# Altium footprint library bethu.PcbLib: 628 footprints (part 21 of 40)
Each footprint in its own frame and in the unit in brackets; x right, y up, seen from the top. Pads: shape width x height; smd on the part's side, far side on the other; paste and mask are expansions set on the pad; w line width, h text height; cw(c..) or ccw(c..) is an arc to the next point about the centre after c.
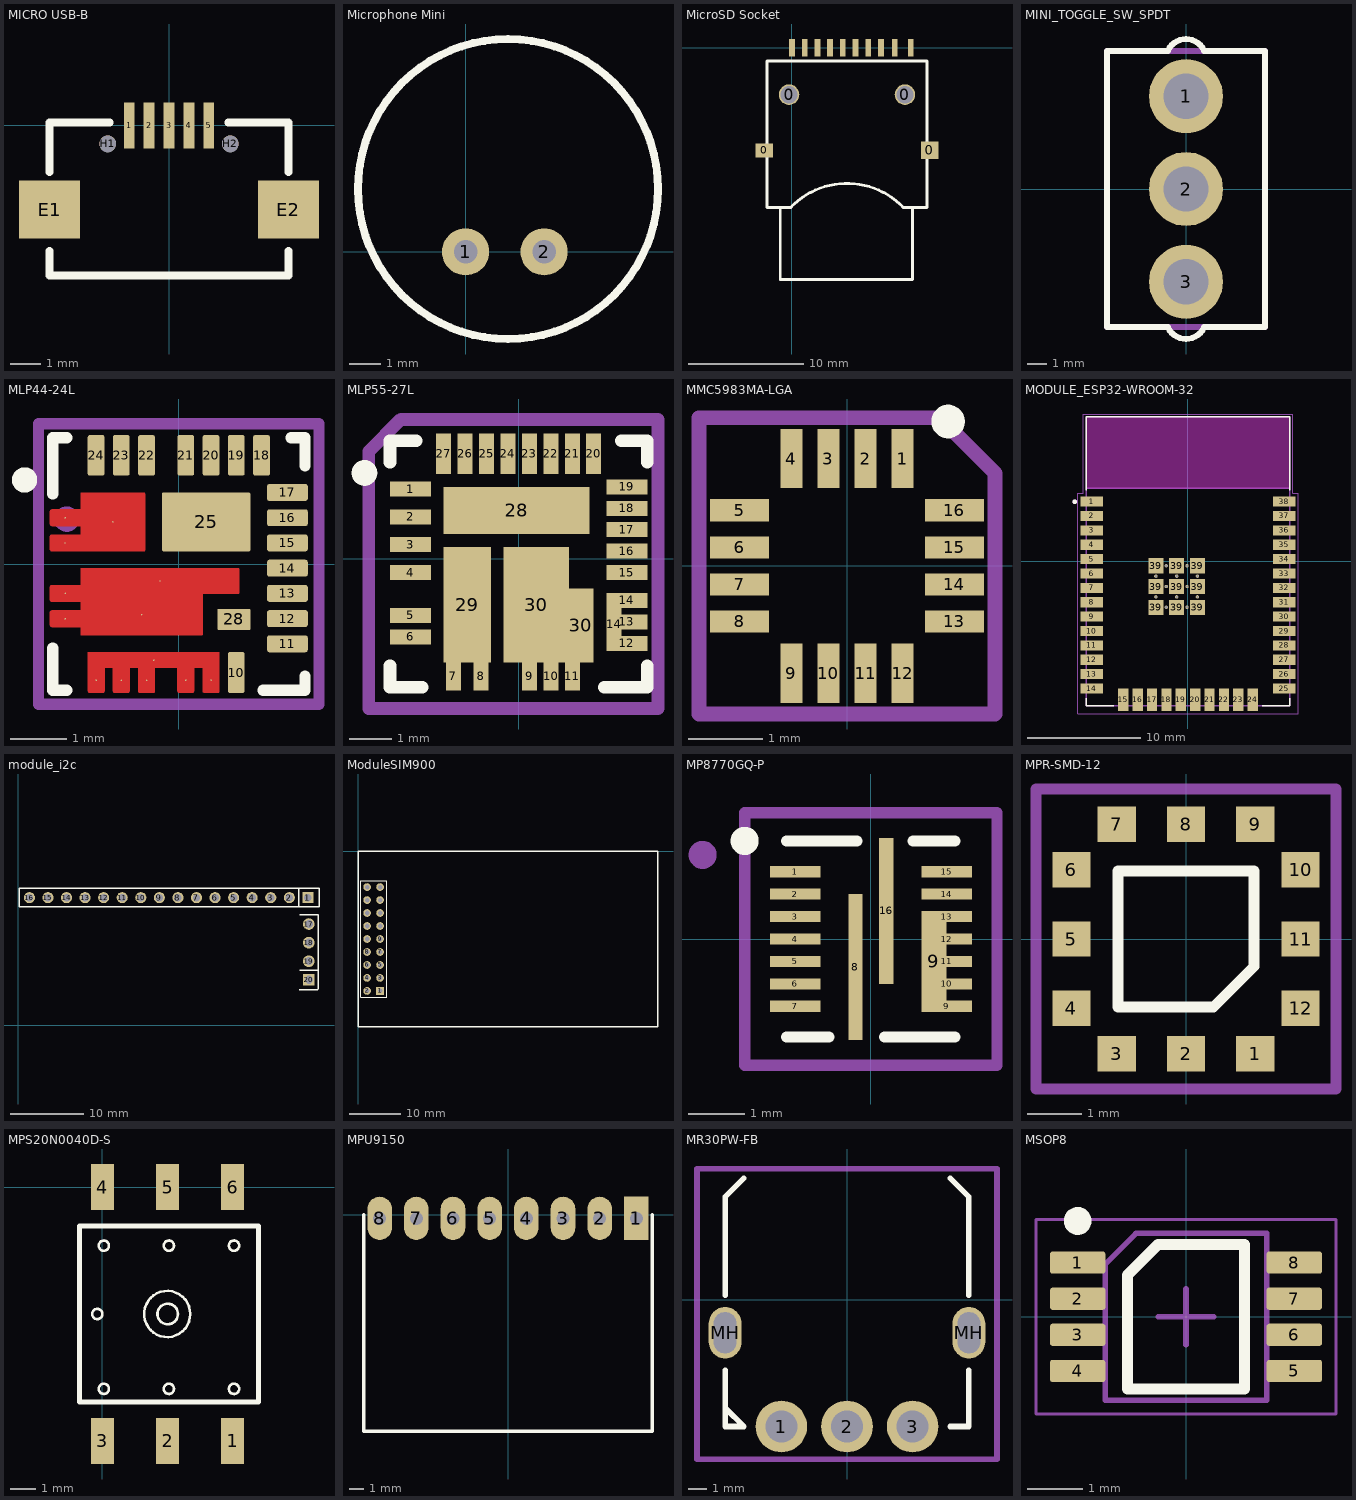
[diagram p20: the footprints below, top view; thin cyan lines are the x and y axes]

## MICRO USB-B [mm]
pads (9):
  rect 0.35x1.5 smd: 1(-1.3,0) 2(-0.65,0) 3(0,0) 4(0.65,0) 5(1.3,0)
  rect 2x1.9 smd: E1(-3.9,-2.75) E2(3.9,-2.75)
  round 0.55 hole 0.55: H1(-2,-0.6) H2(2,-0.6)
Top Overlay:
  lines w0.254: -3.9,-4.101 -3.9,-4.9 3.9,-4.9 3.9,-4.101 ; -3.9,-1.524 -3.9,0.1 -1.932,0.1 ; 1.932,0.1 3.9,0.1 3.9,-1.524
3D body "User Library-Micro USB.STEP": height 2.74, standoff -0.2, extent -3.99,-5.32 3.99,0.11

## Microphone Mini [mil]
pads (2):
  round 60 hole 30: 1(0,0) 2(100,0)
Top Overlay:
  circle w10: c54.06,80 r190.94
3D body "cma-4544pf-w.stp": height 185.04, standoff -177.17, extent -140.94,-110.94 240.95,270.94

## MicroSD Socket [mm]
pads (14):
  rect 1.5x1.2 smd: 0(-2.413,-8.89)
  round 1.778 hole 1.5 unplated: 0(-0.254,-4.064) 0(9.779,-4.064)
  rect 0.5x1.5 smd: 0(8.89,0) 0(10.287,0) 1(0,0) 2(1.1,0) 3(2.2,0) 4(3.3,0) 5(4.4,0) 6(5.5,0) 7(6.6,0) 8(7.7,0)
  rect 1.5x1.5 smd: 0(11.938,-8.89)
Top Overlay:
  lines w0.254: -0.127,-13.843 -1.016,-13.843 ; -0.125,-13.845 cw(c4.763,-18.479) 9.65,-13.845 ; 9.652,-13.843 10.414,-13.843 ; -1.016,-13.843 -2.159,-13.843 -2.159,-1.143 11.684,-1.143 11.684,-13.843 10.414,-13.843 ; -1.016,-13.843 -1.016,-20.066 10.414,-20.066 10.414,-13.843
3D body "User Library-Socket-MicroSD-Type1-with-SDCard.STEP": height 1.81, standoff -0.53, extent -2.286,-20.1 11.814,0

## MINI_TOGGLE_SW_SPDT [mm]
pads (3):
  round 3.75 hole 2.3: 1(0,4.7) 2(0,0) 3(0,-4.7)
Top Overlay:
  lines w0.3: -0.922,-7 -4,-7 -4,-0.5 -4,7 -0.922,7 ; -0.906,-7.023 ccw(c0,-6.6) 0.906,-7.023 ; -0.906,7.023 cw(c0,6.6) 0.906,7.023 ; 0.922,-7 4,-7 4,7 0.922,7
Mechanical 13:
  lines w0.3: -4,-7 4,-7 4,7 -4,7 -4,-7
  text "'.Designator'" at -5.815,-0.9 h1
3D body "Mini Toggle.step": height 27.29, standoff -3.93, extent -3.43,-6.35 3.43,6.35

## MLP44-24L [mm]
height 0.8
pads (30):
  round 0.025 smd mask+0.1: 1(-2.025,0.825) 2(-2.025,0.375) 3(-2.025,-0.525) 4(-2.025,-0.975) 5(-1.475,-2.075) 5(-0.45,-1.713) 6(-1.025,-2.075) 7(-0.575,-2.075) 8(0.125,-2.075) 9(0.575,-2.075)
  rrect25% 0.3x0.73 smd mask+0.1: 10(1.025,-1.935)
  rrect25% 0.725x0.3 smd mask+0.1: 11(1.937,-1.424) 12(1.937,-0.974) 13(1.937,-0.524) 14(1.937,-0.074) 15(1.937,0.376) 16(1.937,0.826) 17(1.937,1.276)
  rrect25% 0.3x0.725 smd mask+0.1: 18(1.475,1.938) 19(1.025,1.938) 20(0.575,1.938) 21(0.125,1.938) 22(-0.575,1.938) 23(-1.025,1.938) 24(-1.475,1.938)
  rrect5% 1.575x1.05 smd mask+0.07: 25(0.488,0.75)
  round 0.025 smd mask+0.102: 26(-1.175,0.75)
  round 0.025 smd mask+0.07: 27(-0.663,-0.902) 27(-0.338,-0.303)
  rrect5% 0.58x0.38 smd mask+0.07: 28(0.984,-0.989)
Top Layer:
  region: -0.626,0.225 -1.75,0.225 -1.75,1.275 -0.626,1.275 -0.621,1.275 -0.611,1.271 -0.604,1.264 -0.6,1.254 -0.6,1.249 -0.6,0.251 -0.6,0.246 -0.604,0.236 -0.611,0.229 -0.621,0.225
  region: -1.325,-2.263 -1.325,-2.27 -1.331,-2.284 -1.341,-2.294 -1.355,-2.3 -1.362,-2.3 -1.588,-2.3 -1.595,-2.3 -1.609,-2.294 -1.619,-2.284 -1.625,-2.27 -1.625,-2.263 -1.625,-1.85 -1.325,-1.85
  region: 0.725,-2.263 0.725,-2.27 0.719,-2.284 0.709,-2.294 0.695,-2.3 0.688,-2.3 0.462,-2.3 0.455,-2.3 0.441,-2.294 0.431,-2.284 0.425,-2.27 0.425,-2.263 0.425,-1.85 0.725,-1.85
  region: 0.275,-2.263 0.275,-2.27 0.269,-2.284 0.259,-2.294 0.245,-2.3 0.238,-2.3 0.012,-2.3 0.005,-2.3 -0.009,-2.294 -0.019,-2.284 -0.025,-2.27 -0.025,-2.263 -0.025,-1.85 0.275,-1.85
  region: -0.425,-2.263 -0.425,-2.27 -0.431,-2.284 -0.441,-2.294 -0.455,-2.3 -0.462,-2.3 -0.688,-2.3 -0.695,-2.3 -0.709,-2.294 -0.719,-2.284 -0.725,-2.27 -0.725,-2.263 -0.725,-1.85 -0.425,-1.85
  region: -0.875,-2.263 -0.875,-2.27 -0.881,-2.284 -0.891,-2.294 -0.905,-2.3 -0.912,-2.3 -1.138,-2.3 -1.145,-2.3 -1.159,-2.294 -1.169,-2.284 -1.175,-2.27 -1.175,-2.263 -1.175,-1.85 -0.875,-1.85
  region: 0.725,-1.85 -1.625,-1.85 -1.625,-1.582 -1.625,-1.581 -1.624,-1.578 -1.622,-1.577 -1.619,-1.575 -1.618,-1.575 0.718,-1.575 0.719,-1.575 0.722,-1.577 0.724,-1.578 0.725,-1.581 0.725,-1.582
  region: -2.263,0.675 -2.27,0.675 -2.284,0.681 -2.294,0.691 -2.3,0.705 -2.3,0.712 -2.3,0.938 -2.3,0.945 -2.294,0.959 -2.284,0.969 -2.27,0.975 -2.263,0.975 -1.75,0.975 -1.75,0.675
  region: -2.263,0.225 -2.27,0.225 -2.284,0.231 -2.294,0.241 -2.3,0.255 -2.3,0.262 -2.3,0.488 -2.3,0.495 -2.294,0.509 -2.284,0.519 -2.27,0.525 -2.263,0.525 -1.75,0.525 -1.75,0.225
  region: -2.263,-0.675 -2.27,-0.675 -2.284,-0.669 -2.294,-0.659 -2.3,-0.645 -2.3,-0.638 -2.3,-0.412 -2.3,-0.405 -2.294,-0.391 -2.284,-0.381 -2.27,-0.375 -2.263,-0.375 -1.75,-0.375 -1.75,-0.675
  region: -2.263,-1.125 -2.27,-1.125 -2.284,-1.119 -2.294,-1.109 -2.3,-1.095 -2.3,-1.088 -2.3,-0.862 -2.3,-0.855 -2.294,-0.841 -2.284,-0.831 -2.27,-0.825 -2.263,-0.825 -1.75,-0.825 -1.75,-1.125
  region: -1.732,-1.275 -1.736,-1.275 -1.742,-1.272 -1.748,-1.266 -1.751,-1.26 -1.751,-1.256 -1.751,-0.529 0.425,-0.529 0.425,-1.256 0.425,-1.26 0.422,-1.266 0.416,-1.272 0.41,-1.275 0.406,-1.275
  region: 1.063,-0.53 -1.751,-0.53 -1.751,-0.087 -1.751,-0.085 -1.749,-0.08 -1.746,-0.077 -1.741,-0.075 -1.739,-0.075 1.063,-0.075 1.065,-0.075 1.07,-0.077 1.073,-0.08 1.075,-0.085 1.075,-0.087 1.075,-0.519 1.075,-0.521 1.073,-0.526 1.07,-0.529 1.065,-0.53
Top Overlay:
  circle w0.25: c-2.75,1.5 r0.1
  lines w0.2: -2.25,-1.5 -2.25,-2.25 -2,-2.25 ; -2.25,1.25 -2.25,2.25 -2,2.25 ; 1.5,-2.25 2.25,-2.25 2.25,-2 ; 2,2.25 2.25,2.25 2.25,1.75
Mechanical 13:
  circle w0.25: c-2,0.8 r0.1
  lines w0.2: -2.5,-2.5 2.5,-2.5 2.5,2.5 -2.5,2.5 -2.5,-2.5
  text "'.Designator'" at -5.665,-0.417 h1
3D body "SIC438BED-T1-GE3.stp": height 0.9, standoff 0, extent -2,-2 2,2

## MLP55-27L [mm]
pads (32):
  rect 0.95x0.35 smd mask+0.1: 1(-2.525,1.625) 2(-2.525,0.975) 3(-2.525,0.325) 4(-2.525,-0.325) 5(-2.525,-1.325) 6(-2.525,-1.825) 12(2.525,-1.975) 13(2.525,-1.475) 14(2.525,-0.975) 15(2.525,-0.325) 16(2.525,0.175) 17(2.525,0.675) 18(2.525,1.175) 19(2.525,1.675)
  rect 0.35x0.65 smd mask+0.1: 7(-1.525,-2.75) 8(-0.875,-2.75) 9(0.255,-2.75) 10(0.755,-2.75) 11(1.255,-2.75)
  rect 0.35x0.95 smd mask+0.05: 14(2.225,-1.525)
  rect 0.35x0.95 smd mask+0.1: 20(1.75,2.45) 21(1.25,2.45) 22(0.75,2.45) 23(0.25,2.45) 24(-0.25,2.45) 25(-0.75,2.45) 26(-1.25,2.45) 27(-1.75,2.45)
  rect 3.4x1.1 smd mask+0.05: 28(-0.05,1.125)
  rect 1.1x2.7 smd mask+0.05: 29(-1.2,-1.075)
  rect 1.52x2.7 smd mask+0.05: 30(0.41,-1.075)
  rect 0.58x1.73 smd mask+0.05: 30(1.45,-1.56)
Top Overlay:
  circle w0.3: c-3.6,2 r0.15
  lines w0.3: -3,-2.5 -3,-3 -2.25,-3 ; -3,2.25 -3,2.75 -2.4,2.75 ; 2,-3 3,-3 3,-2.5 ; 2.4,2.75 3,2.75 3,2.25
Mechanical 13:
  lines w0.3: -3.5,-3.5 3.25,-3.5 3.25,3.25 -2.75,3.25 -3.5,2.5 -3.5,-3.5
  text "'.Designator'" at -6.315,-1.4 h1
3D body "MLP55-27L.STEP": height 0.8, standoff 0, extent -2.5,-2.575 2.501,2.425

## MMC5983MA-LGA [mm]
pads (16):
  rect 0.3x0.8 smd mask+0.05: 1(0.75,1.45) 2(0.25,1.45) 3(-0.25,1.45) 4(-0.75,1.45) 9(-0.75,-1.45) 10(-0.25,-1.45) 11(0.25,-1.45) 12(0.75,-1.45)
  rect 0.8x0.3 smd mask+0.05: 5(-1.45,0.75) 6(-1.45,0.25) 7(-1.45,-0.25) 8(-1.45,-0.75) 13(1.45,-0.75) 14(1.45,-0.25) 15(1.45,0.25) 16(1.45,0.75)
Top Overlay:
  circle w0.25: c1.364,1.95 r0.101
Mechanical 13:
  lines w0.2: -2,-2 2,-2 2,1.25 1.25,2 -2,2 -2,-0.25 -2,-2
3D body "MMC5983MA.step": height 0.99, standoff 0, extent -1.549,-1.549 1.549,1.549

## MODULE_ESP32-WROOM-32 [mm]
height 3.2
pads (59):
  rect 2x0.9 smd: 1(-8.5,5.26) 2(-8.5,3.99) 3(-8.5,2.72) 4(-8.5,1.45) 5(-8.5,0.18) 6(-8.5,-1.09) 7(-8.5,-2.36) 8(-8.5,-3.63) 9(-8.5,-4.9) 10(-8.5,-6.17) 11(-8.5,-7.44) 12(-8.5,-8.71) 13(-8.5,-9.98) 14(-8.5,-11.25) 25(8.5,-11.25) 26(8.5,-9.98) 27(8.5,-8.71) 28(8.5,-7.44) 29(8.5,-6.17) 30(8.5,-4.9) 31(8.5,-3.63) 32(8.5,-2.36) 33(8.5,-1.09) 34(8.5,0.18) 35(8.5,1.45) 36(8.5,2.72) 37(8.5,3.99) 38(8.5,5.26)
  rect 0.9x2 smd: 15(-5.715,-12.25) 16(-4.445,-12.25) 17(-3.175,-12.25) 18(-1.905,-12.25) 19(-0.635,-12.25) 20(0.635,-12.25) 21(1.905,-12.25) 22(3.175,-12.25) 23(4.445,-12.25) 24(5.715,-12.25)
  rect 1.33x1.33 smd: 39(-2.835,-4.075) 39(-2.835,-2.24) 39(-2.835,-0.405) 39(-1,-4.075) 39(-1,-2.24) 39(-1,-0.405) 39(0.835,-4.075) 39(0.835,-2.24) 39(0.835,-0.405)
  round 0.3 hole 0.2: 39_10(-1.917,-0.405) 39_11(-0.082,-0.405) 39_12(-2.835,-1.322) 39_13(-1,-1.322) 39_14(0.835,-1.322) 39_15(-1.917,-2.24) 39_16(-0.082,-2.24) 39_17(-2.835,-3.157) 39_18(-1,-3.157) 39_19(0.835,-3.157) 39_20(-1.917,-4.075) 39_21(-0.082,-4.075)
Top Overlay:
  circle w0.2: c-10,5.25 r0.1
  lines w0.127: -9,-12.1 -9,-12.75 -6.55,-12.75 ; -9,6.25 -9,12.75 9,12.75 9,6.25 ; 6.55,-12.75 9,-12.75 9,-12.1
Keep-Out Layer:
  region: 9,6.45 -9,6.45 -9,12.75 9,12.75
  region: 9,6.45 -9,6.45 -9,12.75 9,12.75
Mechanical 13:
  circle w0.2: c-10,5.25 r0.1
  lines w0.127: -9,6.45 9,6.45 ; -9,6.45 -9,12.75 9,12.75 9,6.45 ; -9,6.45 -9,-12.75 9,-12.75 9,6.45
  text "ANTENNA" at -6,9 h1.78
Mechanical 15:
  lines w0.05: -9.75,-13.5 -9.75,6 -9.25,6 -9.25,13 9.25,13 9.25,6 9.75,6 9.75,-13.5 -9.75,-13.5
3D body "step_temp.STEP": height 3.2, standoff 0, extent -9,-12.75 9,12.75

## module_i2c [mm]
pads (20):
  rect 1.52x1.52 hole 1.02: 1(39.599,17.424)
  round 1.52 hole 1.02: 2(37.059,17.424) 3(34.519,17.424) 4(31.979,17.424) 5(29.439,17.424) 6(26.899,17.424) 7(24.359,17.424) 8(21.819,17.424) 9(19.279,17.424) 10(16.739,17.424) 11(14.199,17.424) 12(11.659,17.424) 13(9.119,17.424) 14(6.579,17.424) 15(4.039,17.424) 16(1.499,17.424)
  round 1.6 hole 1.1: 17(39.726,13.818) 18(39.726,11.278) 19(39.726,8.738)
  rect 1.6x1.6 hole 1.1: 20(39.726,6.198)
Top Overlay:
  lines w0.2: 38.329,16.154 38.329,18.694 ; 38.405,4.851 40.945,4.851 ; 38.456,7.468 40.996,7.468 ; 38.456,15.088 40.996,15.088 40.996,4.928 ; 0.076,16.154 38.964,16.154 41.118,16.154 41.118,18.694 0.076,18.694 0.076,16.154
3D body "61300411121.stp": height 5.54, standoff -6, extent 38.456,4.928 40.996,15.088
3D body "1602 I2c v1.STEP": height 9.34, standoff -5.5, extent -0.025,0.178 41.575,19.335

## ModuleSIM900 [mm]
pads (18):
  rect 1.5x1.5 hole 0.9: 1(4.318,-27.305)
  round 1.5 hole 0.9: 2(1.778,-27.305) 3(4.318,-24.765) 4(1.778,-24.765) 5(4.318,-22.225) 6(1.778,-22.225) 7(4.318,-19.685) 8(1.778,-19.685) 9(4.318,-17.145) 10(1.778,-17.145) 11(4.318,-14.605) 12(1.778,-14.605) 13(4.318,-12.065) 14(1.778,-12.065) 15(4.318,-9.525) 16(1.778,-9.525) 17(4.318,-6.985) 18(1.778,-6.985)
Top Overlay:
  lines w0.2: 0.508,-28.575 0.508,-5.715 5.588,-5.715 5.588,-28.575 0.508,-28.575
  lines w0.254: 0,-34.29 58.7,-34.29 58.7,0 0,0 0,-34.29
3D body "User Library-RM254_4pin.STEP": height 6.02, standoff -3.1, extent 3.048,-15.875 5.588,-5.715
3D body "User Library-RM254_4pin.STEP": height 6.02, standoff -3.1, extent 0.508,-15.875 3.048,-5.715
3D body "User Library-RM254_4pin.STEP": height 6.02, standoff -3.1, extent 3.048,-20.955 5.588,-10.795
3D body "User Library-RM254_4pin.STEP": height 6.02, standoff -3.1, extent 0.508,-23.495 3.048,-13.335
3D body "User Library-RM254_4pin.STEP": height 6.02, standoff -3.1, extent 0.508,-28.575 3.048,-18.415
3D body "User Library-RM254_4pin.STEP": height 6.02, standoff -3.1, extent 3.048,-28.575 5.588,-18.415

## MP8770GQ-P [mm]
pads (17):
  rect 0.9x0.2 smd: 1(-1.35,1.2) 2(-1.35,0.8) 3(-1.35,0.4) 4(-1.35,0) 5(-1.35,-0.4) 6(-1.35,-0.8) 7(-1.35,-1.2) 9(1.35,-1.2) 10(1.35,-0.8) 11(1.35,-0.4) 12(1.35,0) 13(1.35,0.4) 14(1.35,0.8) 15(1.35,1.2)
  rect 0.25x2.6 smd: 8(-0.275,-0.5) 16(0.275,0.5)
  rect 0.45x1.8 smd: 9(1.125,-0.4)
Top Overlay:
  circle w0.3: c-2.25,1.75 r0.1
  lines w0.2: -1.5,-1.75 -0.75,-1.75 ; -1.5,1.75 -0.25,1.75 ; 0.25,-1.75 1.5,-1.75 ; 0.75,1.75 1.5,1.75
Mechanical 13:
  circle w0.3: c-3,1.5 r0.1
  lines w0.2: -2.25,-2.25 2.25,-2.25 2.25,2.25 -2.25,2.25 -2.25,-2.25
  text "'.Designator'" at -5.815,-0.9 h1
3D body "MP8770CGQ.step": height 0.86, standoff 0.01, extent -1.5,-1.5 1.5,1.5

## MPR-SMD-12 [mm]
pads (12):
  rect 0.7x0.65 smd mask+0.03: 1(1.27,-2.1) 2(0,-2.1) 3(-1.27,-2.1) 4(-2.1,-1.27) 5(-2.1,0) 6(-2.1,1.27) 7(-1.27,2.1) 8(0,2.1) 9(1.27,2.1) 10(2.1,1.27) 11(2.1,0) 12(2.1,-1.27)
Top Overlay:
  lines w0.2: -1.25,-1.25 0.5,-1.25 1.25,-0.5 1.25,1.25 -1.25,1.25 -1.25,-1.25
Mechanical 13:
  lines w0.2: -2.75,-2.75 2.75,-2.75 2.75,2.75 -2.75,2.75 -2.75,-2.75
  text "'.Designator'" at -5.84,-0.925 h1
3D body "MPRLS.stp": height 5.83, standoff 0.01, extent -2.444,-2.445 2.446,2.445

## MPS20N0040D-S [mm]
pads (6):
  rect 0.9x1.8 smd: 1(5.08,-9.906) 2(2.54,-9.906) 3(0,-9.906) 4(0,0) 5(2.54,0) 6(5.08,0)
Top Overlay:
  circle w0.1: c2.548,-4.953 r0.4
  circle w0.1: c2.529,-4.953 r0.9
  circle w0.1: c-0.2,-4.953 r0.2
  circle w0.1: c0.054,-2.286 r0.2
  circle w0.1: c2.594,-2.286 r0.2
  circle w0.1: c5.134,-2.286 r0.2
  circle w0.1: c0.054,-7.874 r0.2
  circle w0.1: c2.594,-7.874 r0.2
  circle w0.1: c5.134,-7.874 r0.2
  lines w0.2: -0.889,-8.382 6.096,-8.382 6.096,-1.524 -0.889,-1.524 -0.889,-8.382
3D body "mps20n1.STEP": height 10, standoff 0, extent -0.96,-10.103 6.04,0.197

## MPU9150 [mm]
pads (8):
  rect 1.7x3 hole 0.9: 1(8.89,-0.254)
  oval 1.7x3 hole 0.9: 2(6.35,-0.254) 3(3.81,-0.254) 4(1.27,-0.254) 5(-1.27,-0.254) 6(-3.81,-0.254) 7(-6.35,-0.254) 8(-8.89,-0.254)
Top Overlay:
  lines w0.254: -10,0 -10,-15 10,-15 10,0

## MR30PW-FB [mm]
pads (5):
  round 2.75 hole 1.7: 1(-3.5,-6.75) 2(0,-6.75) 3(3.5,-6.75)
  oval 1.75x2.75 hole 1.2 slot 2.2 at 90 deg: MH(-6.5,-1.75) MH(6.5,-1.75)
Top Overlay:
  lines w0.3: -6.5,-3.75 -6.5,-6.75 -5.5,-6.75 -6.5,-5.75 ; -6.5,0.25 -6.5,5.5 -5.5,6.5 ; 5.5,-6.75 6.5,-6.75 6.5,-4 6.5,-3.75 ; 5.5,6.5 6.5,5.5 6.5,0.25 ; -6.5,-5.75 -6.5,-5.75
Mechanical 13:
  lines w0.3: -8,-8.5 8,-8.5 8,7 -8,7 -8,-8.5
  text "'.Designator'" at -5.84,-0.925 h1
3D body "MR30PW-FB.STEP": height 4.96, standoff -1.99, extent -7.7,-7.7 7.7,6.75

## MSOP8 [mm] "TSOP, 8-Leads, Body 2.90x2.80mm, Pitch 0.65mm, IPC Medium Density"
height 0.9
pads (8):
  rrect25% 1x0.4 smd mask+0.05: 1(-1.95,0.975) 2(-1.95,0.325) 3(-1.95,-0.325) 4(-1.95,-0.975) 5(1.95,-0.975) 6(1.95,-0.325) 7(1.95,0.325) 8(1.95,0.975)
Top Overlay:
  circle w0.25: c-1.95,1.725 r0.125
  lines w0.2: -1.05,-1.3 1.05,-1.3 1.05,1.3 -0.5,1.3 -1.05,0.75 -1.05,-1.3
Mechanical 13:
  lines w0.1: -1.45,-1.5 -1.45,0.95 -0.9,1.5 1.45,1.5 1.45,-1.5 -1.45,-1.5
  text "'.Designator'" at -5.815,-0.9 h1
Mechanical 15:
  lines w0.05: -2.7,-1.75 -2.7,1.75 2.7,1.75 2.7,-1.75 -2.7,-1.75
  lines w0.1: -0.5,0 0.5,0 ; 0,-0.5 0,0.5
3D body "MSOP8.step": height 0.9, standoff 0, extent -2,-1.5 2,1.5